# Altium footprint library hallglib.PcbLib: 98 footprints (part 3 of 7)
Each footprint in its own frame and in the unit in brackets; x right, y up, seen from the top. Pads: shape width x height; smd on the part's side, far side on the other; paste and mask are expansions set on the pad; w line width, h text height; cw(c..) or ccw(c..) is an arc to the next point about the centre after c.
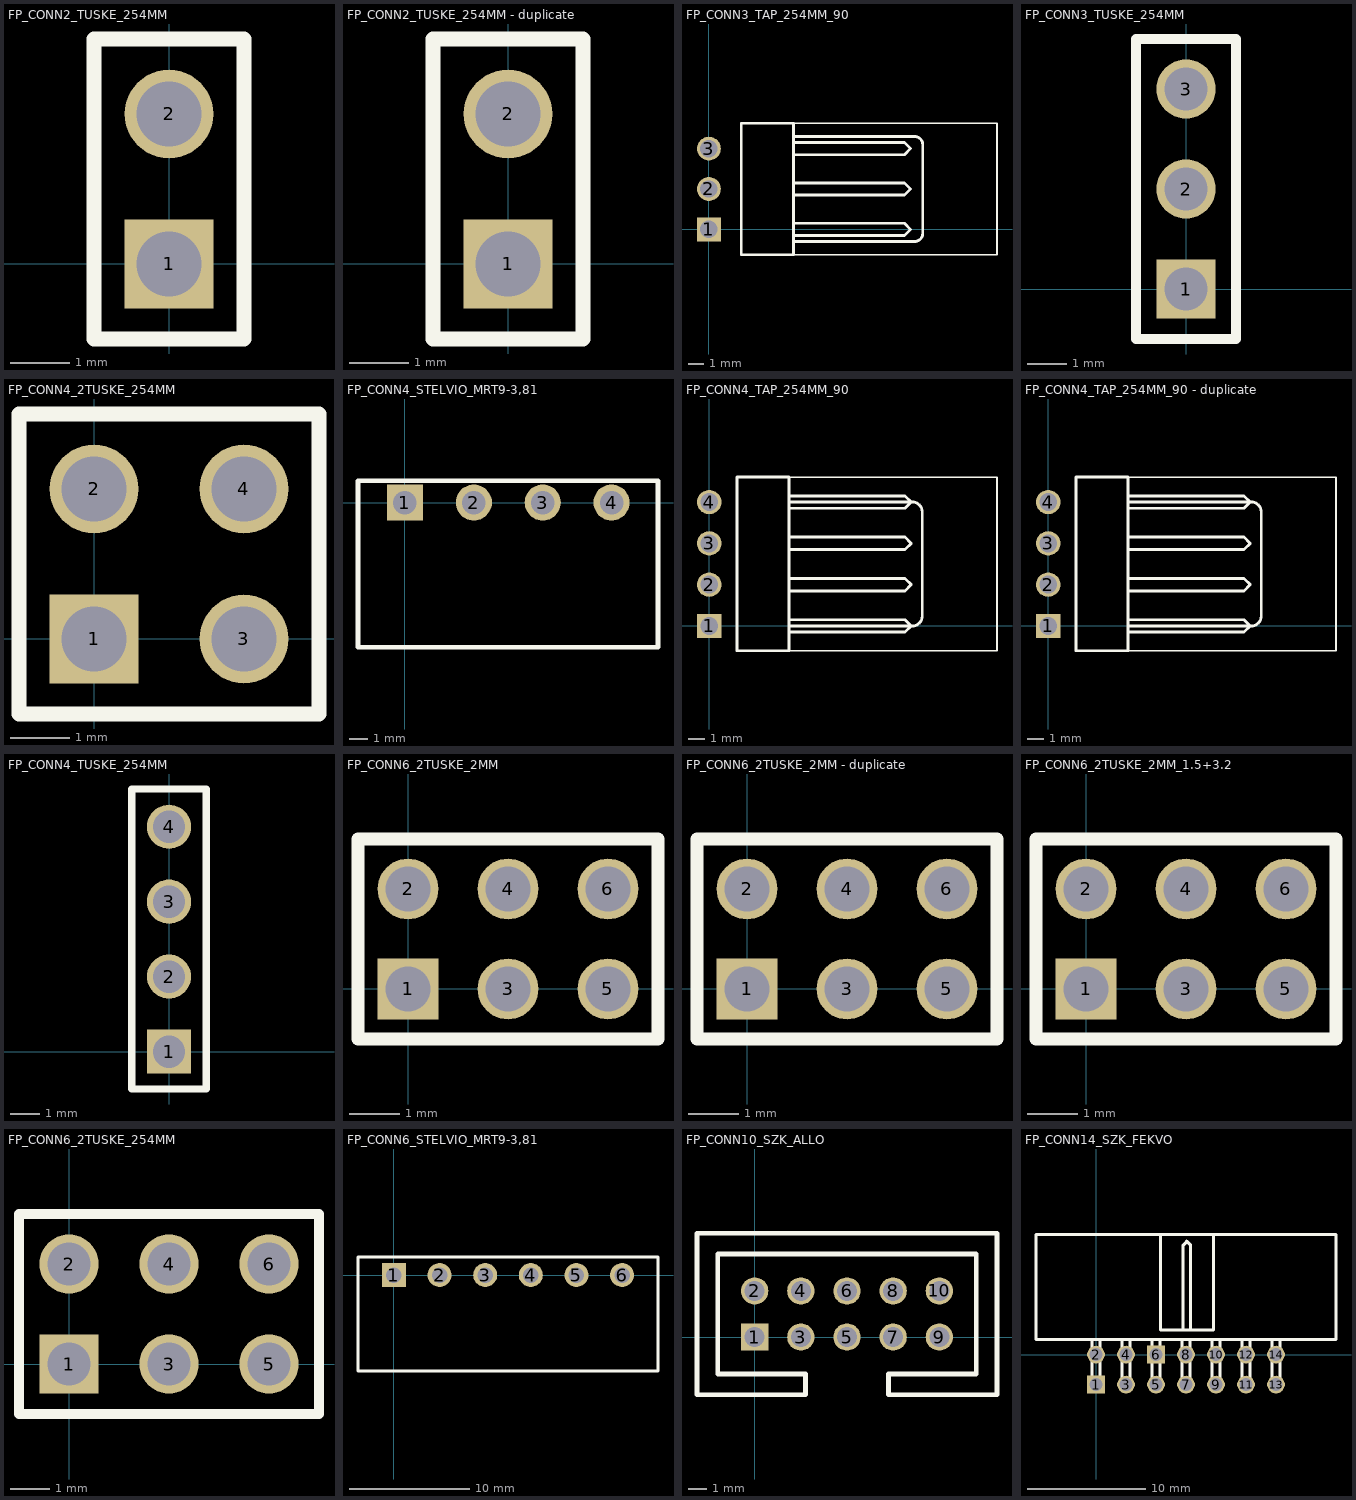
[diagram p2: the footprints below, top view; thin cyan lines are the x and y axes]

## FP_CONN2_TUSKE_254MM [mm] "2×1 tüskesor"
height 8.54
pads (2):
  rect 1.5x1.5 hole 1.1: 1(0,0)
  round 1.5 hole 1.1: 2(0,2.54)
Top Overlay:
  lines w0.254: -1.27,-1.27 -1.27,3.81 1.27,3.81 1.27,-1.27 -1.27,-1.27
3D body: height 2.54, standoff 0, extent -1.27,-1.27 1.27,3.81
3D body: height 0, standoff -3, extent -0.33,-0.33 0.33,0.33
3D body: height 0, standoff -3, extent -0.33,2.21 0.33,2.87
3D body: height 8.54, standoff 2.54, extent -0.33,2.21 0.33,2.87
3D body: height 8.54, standoff 2.54, extent -0.33,-0.33 0.33,0.33

## FP_CONN2_TUSKE_254MM - duplicate [mm] "2×1 tüskesor"
height 8.54
pads (2):
  rect 1.5x1.5 hole 1.1: 1(0,0)
  round 1.5 hole 1.1: 2(0,2.54)
Top Overlay:
  lines w0.254: -1.27,-1.27 1.27,-1.27 1.27,3.81 -1.27,3.81 -1.27,-1.27
3D body: height 8.54, standoff 2.54, extent -0.33,-0.33 0.33,0.33
3D body: height 8.54, standoff 2.54, extent -0.33,2.21 0.33,2.87
3D body: height 0, standoff -3, extent -0.33,2.21 0.33,2.87
3D body: height 0, standoff -3, extent -0.33,-0.33 0.33,0.33
3D body: height 2.54, standoff 0, extent -1.27,-1.27 1.27,3.81

## FP_CONN3_TAP_254MM_90 [mm] "fekvõ három pólusú tápcsatlakozó 2.54mm"
height 11.4
pads (3):
  rect 1.5x1.5 hole 1.1: 1(0,0)
  round 1.5 hole 1.1: 2(0,2.54) 3(0,5.08)
Top Overlay:
  lines w0.102: 5.334,-1.6 18.136,-1.6 18.136,6.68 5.334,6.68
  lines w0.178: 5.334,-1.6 2.032,-1.6 2.032,6.68 5.334,6.68 5.334,-1.524 ; 5.334,-0.762 12.954,-0.762 ccw(c12.954,-0.254) 13.462,-0.254 13.462,5.334 ccw(c12.954,5.334) 12.954,5.842 5.334,5.842 ; 5.334,-0.381 12.319,-0.381 12.7,0 12.319,0.381 5.334,0.381 ; 5.334,2.159 12.319,2.159 12.7,2.54 12.319,2.921 5.334,2.921 ; 5.334,4.699 12.319,4.699 12.7,5.08 12.319,5.461 5.334,5.461
3D body "254_TAP_3P.STEP": height 5.8, standoff -3.4, extent -0.325,-1.3 13.5,6.32

## FP_CONN3_TUSKE_254MM [mm] "3×1 tüskesor"
height 8.54
pads (3):
  rect 1.5x1.5 hole 1.1: 1(0,0)
  round 1.5 hole 1.1: 2(0,2.54) 3(0,5.08)
Top Overlay:
  lines w0.254: -1.27,-1.27 1.27,-1.27 1.27,6.35 -1.27,6.35 -1.27,-1.27
3D body: height 2.54, standoff 0, extent -1.27,3.81 1.27,6.35
3D body: height 0, standoff -3, extent -0.33,4.75 0.33,5.41
3D body: height 8.54, standoff 2.54, extent -0.33,4.75 0.33,5.41
3D body: height 8.54, standoff 2.54, extent -0.33,-0.33 0.33,0.33
3D body: height 8.54, standoff 2.54, extent -0.33,2.21 0.33,2.87
3D body: height 0, standoff -3, extent -0.33,2.21 0.33,2.87
3D body: height 0, standoff -3, extent -0.33,-0.33 0.33,0.33
3D body: height 2.54, standoff 0, extent -1.27,-1.27 1.27,3.81

## FP_CONN4_2TUSKE_254MM [mm] "2×2 tüskesor"
height 8.54
pads (4):
  rect 1.5x1.5 hole 1.1: 1(0,0)
  round 1.5 hole 1.1: 2(0,2.54) 3(2.54,0) 4(2.54,2.54)
Top Overlay:
  lines w0.254: -1.27,-1.27 -1.27,3.81 3.81,3.81 3.81,-1.27 -1.27,-1.27
3D body: height 2.54, standoff 0, extent -1.27,-1.27 3.81,3.81
3D body: height 0, standoff -3, extent -0.33,-0.33 0.33,0.33
3D body: height 0, standoff -3, extent 2.21,-0.33 2.87,0.33
3D body: height 0, standoff -3, extent 2.21,2.21 2.87,2.87
3D body: height 0, standoff -3, extent -0.33,2.21 0.33,2.87
3D body: height 8.54, standoff 2.54, extent -0.33,2.21 0.33,2.87
3D body: height 8.54, standoff 2.54, extent 2.21,2.21 2.87,2.87
3D body: height 8.54, standoff 2.54, extent 2.21,-0.33 2.87,0.33
3D body: height 8.54, standoff 2.54, extent -0.33,-0.33 0.33,0.33

## FP_CONN4_STELVIO_MRT9-3,81 [mm] "STELVIO gyártmányú sorkapocs csatlakozó MRT9 fekvõ"
height 7.25
pads (4):
  rect 2x2 hole 1.3: 1(0,0)
  round 2 hole 1.3: 2(3.81,0) 3(7.62,0) 4(11.43,0)
Top Overlay:
  lines w0.254: -2.6,-8 -2.6,1.2 14,1.2 14,-8 -2.6,-8
3D body: height 0, standoff -3, extent 11.03,-0.4 11.83,0.4
3D body: height 0, standoff -3, extent 7.22,-0.4 8.02,0.4
3D body: height 0, standoff -3, extent 3.41,-0.4 4.21,0.4
3D body: height 0, standoff -3, extent -0.4,-0.4 0.4,0.4
3D body: height 7.25, standoff 6.75, extent -1.5,-8 13,-1.2
3D body: height 1, standoff 0, extent -1.5,-8 13,-1.2
3D body: height 7.25, standoff 0, extent 9.275,-8 9.775,-1.2
3D body: height 7.25, standoff 0, extent 5.462,-8 5.962,-1.2
3D body: height 7.25, standoff 0, extent 1.65,-8 2.15,-1.2
3D body: height 7.25, standoff 0, extent 13,-8 14,-1.2
3D body: height 7.25, standoff 0, extent -2.5,-1.2 14,1.2
3D body: height 7.25, standoff 0, extent -2.5,-8 -1.5,-1.2

## FP_CONN4_TAP_254MM_90 [mm] "fekvõ két pólusú tápcsatlakozó 2.54mm"
height 6.3
pads (4):
  rect 1.5x1.5 hole 1.1: 1(0,0)
  round 1.5 hole 1.1: 2(0,2.54) 3(0,5.08) 4(0,7.62)
Top Overlay:
  lines w0.102: 4.9,-1.53 17.7,-1.53 17.7,9.15 4.9,9.15
  lines w0.178: 4.9,0 12.5,0 ccw(c12.5,0.6) 13.1,0.6 13.1,7.02 ccw(c12.5,7.02) 12.5,7.62 4.9,7.62 ; 4.934,-0.381 12.046,-0.381 12.427,0 12.046,0.381 4.934,0.381 ; 4.934,2.159 12.046,2.159 12.427,2.54 12.046,2.921 4.934,2.921 ; 4.934,4.699 12.046,4.699 12.427,5.08 12.046,5.461 4.934,5.461 ; 4.934,7.239 12.046,7.239 12.427,7.62 12.046,8.001 4.934,8.001 ; 1.7,-1.524 4.9,-1.524 4.9,9.15 1.7,9.15 1.7,-1.524
3D body "254_TAP_4P.STEP": height 5.8, standoff -3.4, extent -0.343,-1.295 13.482,8.865

## FP_CONN4_TAP_254MM_90 - duplicate [mm] "fekvõ két pólusú tápcsatlakozó 2.54mm"
height 6.3
pads (4):
  rect 1.5x1.5 hole 1.1: 1(0,0)
  round 1.5 hole 1.1: 2(0,2.54) 3(0,5.08) 4(0,7.62)
Top Overlay:
  lines w0.102: 4.9,-1.53 17.7,-1.53 17.7,9.15 4.9,9.15
  lines w0.178: 4.9,0 12.5,0 ccw(c12.5,0.6) 13.1,0.6 13.1,7.02 ccw(c12.5,7.02) 12.5,7.62 4.9,7.62 ; 4.934,-0.381 12.046,-0.381 12.427,0 12.046,0.381 4.934,0.381 ; 4.934,2.159 12.046,2.159 12.427,2.54 12.046,2.921 4.934,2.921 ; 4.934,4.699 12.046,4.699 12.427,5.08 12.046,5.461 4.934,5.461 ; 4.934,7.239 12.046,7.239 12.427,7.62 12.046,8.001 4.934,8.001 ; 1.7,-1.524 1.7,9.15 4.9,9.15 4.9,-1.524 1.7,-1.524
3D body: height 6.3, standoff 0, extent 5,-1.5 17.7,9.2
3D body "254_TAP_4P.STEP": height 5.8, standoff -3.4, extent -0.343,-1.295 13.482,8.865

## FP_CONN4_TUSKE_254MM [mm] "4×1 tüskesor"
height 8.54
pads (4):
  rect 1.5x1.5 hole 1.1: 1(0,0)
  round 1.5 hole 1.1: 2(0,2.54) 3(0,5.08) 4(0,7.62)
Top Overlay:
  lines w0.254: -1.27,-1.27 -1.27,8.9 1.27,8.9 1.27,-1.27 -1.27,-1.27
3D body: height 2.54, standoff 0, extent -1.27,-1.27 1.27,3.81
3D body: height 0, standoff -3, extent -0.33,-0.33 0.33,0.33
3D body: height 0, standoff -3, extent -0.33,2.21 0.33,2.87
3D body: height 8.54, standoff 2.54, extent -0.33,2.21 0.33,2.87
3D body: height 8.54, standoff 2.54, extent -0.33,-0.33 0.33,0.33
3D body: height 8.54, standoff 2.54, extent -0.33,4.75 0.33,5.41
3D body: height 8.54, standoff 2.54, extent -0.33,7.29 0.33,7.95
3D body: height 0, standoff -3, extent -0.33,7.29 0.33,7.95
3D body: height 0, standoff -3, extent -0.33,4.75 0.33,5.41
3D body: height 2.54, standoff 0, extent -1.27,3.81 1.27,8.89

## FP_CONN6_2TUSKE_2MM [mm] "2×3-as tüskesor, 2mm-es raszter"
height 5.9
pads (6):
  rect 1.219x1.219 hole 0.9: 1(0,0)
  round 1.219 hole 0.9: 2(0,2) 3(2,0) 4(2,2) 5(4,0) 6(4,2)
Top Overlay:
  lines w0.254: -1,-1 5,-1 5,3 -1,3 -1,-1
3D body: height 5.9, standoff 2, extent -0.254,1.753 0.254,2.261
3D body: height 5.9, standoff 2, extent 1.753,-0.254 2.261,0.254
3D body: height 5.9, standoff 2, extent 1.753,1.753 2.261,2.261
3D body: height 5.9, standoff 2, extent 3.759,-0.254 4.267,0.254
3D body: height 5.9, standoff 2, extent 3.759,1.727 4.267,2.235
3D body: height 5.9, standoff 2, extent -0.254,-0.254 0.254,0.254
3D body: height 2, standoff 0, extent -1.016,-1.016 4.953,2.921
3D body: height 0, standoff -2.8, extent -0.254,-0.254 0.254,0.254
3D body: height 0, standoff -2.8, extent 3.759,1.727 4.267,2.235
3D body: height 0, standoff -2.8, extent 3.759,-0.254 4.267,0.254
3D body: height 0, standoff -2.8, extent 1.753,1.753 2.261,2.261
3D body: height 0, standoff -2.8, extent 1.753,-0.254 2.261,0.254
3D body: height 0, standoff -2.8, extent -0.254,1.753 0.254,2.261

## FP_CONN6_2TUSKE_2MM - duplicate [mm] "2×3-as tüskesor, 2mm-es raszter"
height 5.9
pads (6):
  rect 1.219x1.219 hole 0.9: 1(0,0)
  round 1.219 hole 0.9: 2(0,2) 3(2,0) 4(2,2) 5(4,0) 6(4,2)
Top Overlay:
  lines w0.254: -1,-1 -1,3 5,3 5,-1 -1,-1
3D body: height 0, standoff -2.8, extent -0.254,1.753 0.254,2.261
3D body: height 0, standoff -2.8, extent 1.753,-0.254 2.261,0.254
3D body: height 0, standoff -2.8, extent 1.753,1.753 2.261,2.261
3D body: height 0, standoff -2.8, extent 3.759,-0.254 4.267,0.254
3D body: height 0, standoff -2.8, extent 3.759,1.727 4.267,2.235
3D body: height 0, standoff -2.8, extent -0.254,-0.254 0.254,0.254
3D body: height 2, standoff 0, extent -1.016,-1.016 4.953,2.921
3D body: height 5.9, standoff 2, extent -0.254,-0.254 0.254,0.254
3D body: height 5.9, standoff 2, extent 3.759,1.727 4.267,2.235
3D body: height 5.9, standoff 2, extent 3.759,-0.254 4.267,0.254
3D body: height 5.9, standoff 2, extent 1.753,1.753 2.261,2.261
3D body: height 5.9, standoff 2, extent 1.753,-0.254 2.261,0.254
3D body: height 5.9, standoff 2, extent -0.254,1.753 0.254,2.261

## FP_CONN6_2TUSKE_2MM_1.5+3.2 [mm] "2×3-as tüskesor, 2mm-es raszter, 1.5mm mûanyag + 3.2mm tüske SAMTEC-TMM-1XX-01-..."
height 4.7
pads (6):
  rect 1.219x1.219 hole 0.9: 1(0,0)
  round 1.219 hole 0.9: 2(0,2) 3(2,0) 4(2,2) 5(4,0) 6(4,2)
Top Overlay:
  lines w0.254: -1,-1 5,-1 5,3 -1,3 -1,-1
3D body: height 4.7, standoff 1.5, extent -0.254,1.753 0.254,2.261
3D body: height 4.7, standoff 1.5, extent 1.753,-0.254 2.261,0.254
3D body: height 4.7, standoff 1.5, extent 1.753,1.753 2.261,2.261
3D body: height 4.7, standoff 1.5, extent 3.759,-0.254 4.267,0.254
3D body: height 4.7, standoff 1.5, extent 3.759,1.727 4.267,2.235
3D body: height 4.7, standoff 1.5, extent -0.254,-0.254 0.254,0.254
3D body: height 1.5, standoff 0, extent -1.016,-1.016 4.953,2.921
3D body: height 0, standoff -3, extent -0.254,-0.254 0.254,0.254
3D body: height 0, standoff -3, extent 3.759,1.727 4.267,2.235
3D body: height 0, standoff -3, extent 3.759,-0.254 4.267,0.254
3D body: height 0, standoff -3, extent 1.753,1.753 2.261,2.261
3D body: height 0, standoff -3, extent 1.753,-0.254 2.261,0.254
3D body: height 0, standoff -3, extent -0.254,1.753 0.254,2.261

## FP_CONN6_2TUSKE_254MM [mm] "2×3 tüskesor"
height 8.54
pads (6):
  rect 1.5x1.5 hole 1.1: 1(0,0)
  round 1.5 hole 1.1: 2(0,2.54) 3(2.54,0) 4(2.54,2.54) 5(5.08,0) 6(5.08,2.54)
Top Overlay:
  lines w0.254: -1.27,-1.27 6.35,-1.27 6.35,3.81 -1.27,3.81 -1.27,-1.27
3D body: height 8.54, standoff 2.54, extent -0.33,-0.33 0.33,0.33
3D body: height 8.54, standoff 2.54, extent 2.21,-0.33 2.87,0.33
3D body: height 8.54, standoff 2.54, extent 4.75,-0.33 5.41,0.33
3D body: height 8.54, standoff 2.54, extent 4.75,2.21 5.41,2.87
3D body: height 8.54, standoff 2.54, extent 2.21,2.21 2.87,2.87
3D body: height 8.54, standoff 2.54, extent -0.33,2.21 0.33,2.87
3D body: height 0, standoff -3, extent -0.33,2.21 0.33,2.87
3D body: height 0, standoff -3, extent 2.21,2.21 2.87,2.87
3D body: height 0, standoff -3, extent 4.75,2.21 5.41,2.87
3D body: height 0, standoff -3, extent 4.75,-0.33 5.41,0.33
3D body: height 0, standoff -3, extent 2.21,-0.33 2.87,0.33
3D body: height 0, standoff -3, extent -0.33,-0.33 0.33,0.33
3D body: height 2.54, standoff 0, extent -1.27,-1.27 6.35,3.81

## FP_CONN6_STELVIO_MRT9-3,81 [mm] "STELVIO gyártmányú sorkapocs csatlakozó MRT9 fekvõ"
height 7.25
pads (6):
  rect 2x2 hole 1.3: 1(0,0)
  round 2 hole 1.3: 2(3.81,0) 3(7.62,0) 4(11.43,0) 5(15.24,0) 6(19.05,0)
Top Overlay:
  lines w0.254: -3,-8 22.05,-8 22.05,1.5 -3,1.5 -3,-8
3D body: height 7.25, standoff 0, extent -2.5,-8 -1.5,-1.2
3D body: height 7.25, standoff 0, extent -2.5,-1.2 21.5,1.2
3D body: height 7.25, standoff 0, extent 20.5,-8 21.5,-1.2
3D body: height 7.25, standoff 0, extent 1.65,-8 2.15,-1.2
3D body: height 7.25, standoff 0, extent 5.462,-8 5.962,-1.2
3D body: height 7.25, standoff 0, extent 9.275,-8 9.775,-1.2
3D body: height 7.25, standoff 0, extent 13.087,-8 13.587,-1.2
3D body: height 7.25, standoff 0, extent 16.9,-8 17.4,-1.2
3D body: height 1, standoff 0, extent -1.5,-8 20.5,-1.2
3D body: height 7.25, standoff 6.75, extent -1.5,-8 20.5,-1.2
3D body: height 0, standoff -3, extent -0.4,-0.4 0.4,0.4
3D body: height 0, standoff -3, extent 3.41,-0.4 4.21,0.4
3D body: height 0, standoff -3, extent 7.22,-0.4 8.02,0.4
3D body: height 0, standoff -3, extent 11.03,-0.4 11.83,0.4
3D body: height 0, standoff -3, extent 14.84,-0.4 15.64,0.4
3D body: height 0, standoff -3, extent 18.65,-0.4 19.45,0.4

## FP_CONN10_SZK_ALLO [mm]
height 9.1
pads (10):
  rect 1.5x1.5 hole 1.1: 1(0,0)
  round 1.5 hole 1.1: 2(0,2.54) 3(2.54,0) 4(2.54,2.54) 5(5.08,0) 6(5.08,2.54) 7(7.62,0) 8(7.62,2.54) 9(10.16,0) 10(10.16,2.54)
Top Overlay:
  lines w0.254: -3.175,-3.175 -3.175,5.715 13.335,5.715 13.335,-3.175 7.366,-3.175 7.366,-2.032 12.192,-2.032 12.192,4.572 -2.032,4.572 -2.032,-2.032 2.794,-2.032 2.794,-3.175 -3.175,-3.175
3D body: height 9, standoff 2.54, extent -0.33,-0.33 0.33,0.33
3D body: height 9, standoff 2.54, extent 2.21,-0.33 2.87,0.33
3D body: height 9, standoff 2.54, extent 4.75,-0.33 5.41,0.33
3D body: height 9, standoff 2.54, extent 4.75,2.21 5.41,2.87
3D body: height 9, standoff 2.54, extent 2.21,2.21 2.87,2.87
3D body: height 9, standoff 2.54, extent -0.33,2.21 0.33,2.87
3D body: height 3.3, standoff 0, extent -0.33,2.21 0.33,2.87
3D body: height 3.3, standoff 0, extent 2.21,2.21 2.87,2.87
3D body: height 3.3, standoff 0, extent 4.75,2.21 5.41,2.87
3D body: height 3.3, standoff 0, extent 4.75,-0.33 5.41,0.33
3D body: height 3.3, standoff 0, extent 2.21,-0.33 2.87,0.33
3D body: height 3.3, standoff 0, extent -0.33,-0.33 0.33,0.33
3D body: height 9, standoff 2.54, extent 7.29,-0.33 7.95,0.33
3D body: height 9, standoff 2.54, extent 9.83,-0.33 10.49,0.33
3D body: height 9, standoff 2.54, extent 9.83,2.21 10.49,2.87
3D body: height 9, standoff 2.54, extent 7.29,2.21 7.95,2.87
3D body: height 3.3, standoff 0, extent 7.29,2.21 7.95,2.87
3D body: height 3.3, standoff 0, extent 9.83,2.21 10.49,2.87
3D body: height 3.3, standoff 0, extent 9.83,-0.33 10.49,0.33
3D body: height 3.3, standoff 0, extent 7.29,-0.33 7.95,0.33
3D body: height 2.54, standoff 0, extent -3.175,-3.175 13.335,5.715
3D body: height 9, standoff 2.54, extent -3.175,-3.175 13.335,5.715

## FP_CONN14_SZK_FEKVO [mm] "14 póusú fekvõ teknõs szalagkáble csatlakozó"
height 9
pads (14):
  rect 1.5x1.5 hole 1.1: 1(0,-2.54) 6(5.08,0)
  round 1.5 hole 1.1: 2(0,0) 3(2.54,-2.54) 4(2.54,0) 5(5.08,-2.54) 7(7.62,-2.54) 8(7.62,0) 9(10.16,-2.54) 10(10.16,0) 11(12.7,-2.54) 12(12.7,0) 13(15.24,-2.54) 14(15.24,0)
Top Overlay:
  lines w0.254: -0.32,1.27 -0.32,-2.86 0.32,-2.86 0.32,1.27 ; 2.22,1.27 2.22,-2.86 2.86,-2.86 2.86,1.27 ; 4.76,1.27 4.76,-2.86 5.4,-2.86 5.4,1.27 ; 5.446,10.01 5.446,2.06 9.946,2.06 9.946,10.03 ; 7.3,1.27 7.3,-2.86 7.94,-2.86 7.94,1.27 ; 7.376,2.06 7.376,9.26 7.676,9.56 7.676,9.6 8.016,9.26 8.016,2.06 ; 9.84,1.27 9.84,-2.86 10.48,-2.86 10.48,1.27 ; 12.38,1.27 12.38,-2.86 13.02,-2.86 13.02,1.27 ; 14.92,1.27 14.92,-2.86 15.56,-2.86 15.56,1.27 ; -5.08,1.27 20.32,1.27 20.32,10.16 -5.08,10.16 -5.08,1.27
3D body: height 0, standoff -3, extent 14.91,-0.33 15.57,0.33
3D body: height 0, standoff -3, extent 12.37,-0.33 13.03,0.33
3D body: height 0, standoff -3, extent 9.83,-0.33 10.49,0.33
3D body: height 0, standoff -3, extent 7.29,-0.33 7.95,0.33
3D body: height 0, standoff -3, extent 4.75,-0.33 5.41,0.33
3D body: height 0, standoff -3, extent 2.21,-0.33 2.87,0.33
3D body: height 0, standoff -3, extent -0.33,-0.33 0.33,0.33
3D body: height 0, standoff -3, extent 14.91,-2.87 15.57,-2.21
3D body: height 0, standoff -3, extent 12.37,-2.87 13.03,-2.21
3D body: height 0, standoff -3, extent 9.83,-2.87 10.49,-2.21
3D body: height 0, standoff -3, extent 7.29,-2.87 7.95,-2.21
3D body: height 0, standoff -3, extent 4.75,-2.87 5.41,-2.21
3D body: height 0, standoff -3, extent 2.21,-2.87 2.87,-2.21
3D body: height 0, standoff -3, extent -0.33,-2.87 0.33,-2.21
3D body: height 9, standoff 0.3, extent -5.08,3.302 -4.064,10.16
3D body: height 9, standoff 0.3, extent 19.304,3.302 20.32,10.16
3D body: height 1.3, standoff 0.3, extent -5.08,1.27 20.32,10.16
3D body: height 9, standoff 8, extent -5.08,1.27 20.32,10.16
3D body: height 6, standoff 0, extent -0.33,-2.87 0.33,-2.21
3D body: height 6, standoff 0, extent 2.21,-2.87 2.87,-2.21
3D body: height 6, standoff 0, extent 4.75,-2.87 5.41,-2.21
3D body: height 6, standoff 0, extent 7.29,-2.87 7.95,-2.21
3D body: height 6, standoff 0, extent 9.83,-2.87 10.49,-2.21
3D body: height 6, standoff 0, extent 12.37,-2.87 13.03,-2.21
3D body: height 6, standoff 0, extent 14.91,-2.87 15.57,-2.21
3D body: height 3.46, standoff 0, extent 2.21,-0.33 2.87,0.33
3D body: height 3.46, standoff 0, extent 4.75,-0.33 5.41,0.33
3D body: height 3.46, standoff 0, extent 7.29,-0.33 7.95,0.33
3D body: height 3.46, standoff 0, extent 9.83,-0.33 10.49,0.33
3D body: height 3.46, standoff 0, extent 12.37,-0.33 13.03,0.33
3D body: height 3.46, standoff 0, extent 14.91,-0.33 15.57,0.33
3D body: height 3.46, standoff 0, extent -0.33,-0.33 0.33,0.33
3D body: height 3.46, standoff 2.8, extent -0.33,-0.33 0.33,10.16
3D body: height 3.46, standoff 2.8, extent 2.21,-0.33 2.87,10.16
3D body: height 3.46, standoff 2.8, extent 4.75,-0.33 5.41,10.16
3D body: height 3.46, standoff 2.8, extent 7.29,-0.33 7.95,10.16
3D body: height 3.46, standoff 2.8, extent 9.83,-0.33 10.49,10.16
3D body: height 3.46, standoff 2.8, extent 12.37,-0.33 13.03,10.16
3D body: height 3.46, standoff 2.8, extent 14.91,-0.33 15.57,10.16
3D body: height 6, standoff 5.34, extent -0.33,-2.87 0.33,10.16
3D body: height 6, standoff 5.34, extent 2.21,-2.87 2.87,10.16
3D body: height 6, standoff 5.34, extent 4.75,-2.87 5.41,10.16
3D body: height 6, standoff 5.34, extent 7.29,-2.87 7.95,10.16
3D body: height 6, standoff 5.34, extent 9.83,-2.87 10.49,10.16
3D body: height 6, standoff 5.34, extent 12.37,-2.87 13.03,10.16
3D body: height 6, standoff 5.34, extent 14.91,-2.87 15.57,10.16
3D body: height 9, standoff 0.3, extent -5.08,1.27 20.32,3.302